# Altium footprint library MODULE.PcbLib: 33 footprints (part 3 of 3)
Each footprint in its own frame and in the unit in brackets; x right, y up, seen from the top. Pads: shape width x height; smd on the part's side, far side on the other; paste and mask are expansions set on the pad; w line width, h text height; cw(c..) or ccw(c..) is an arc to the next point about the centre after c.
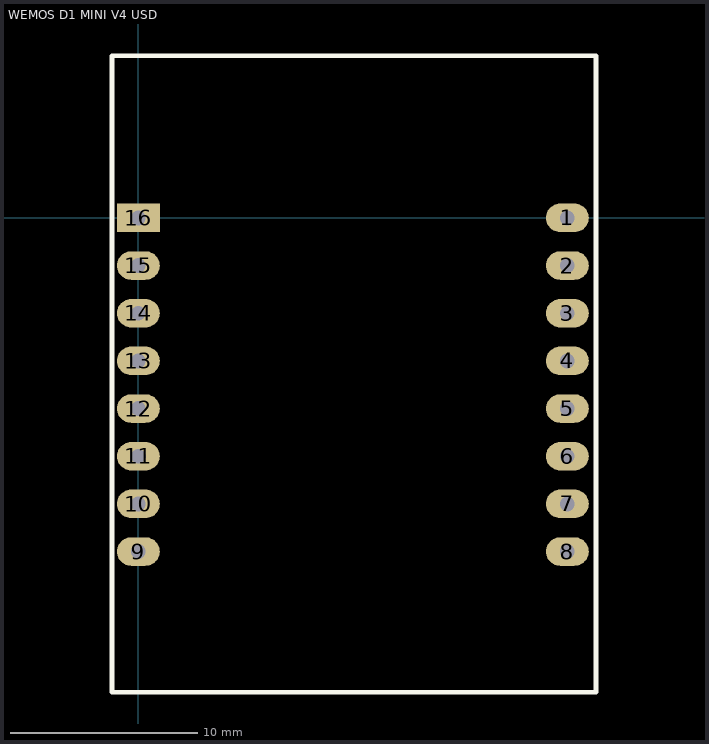
[diagram p2: the footprint, top view; thin cyan lines are the x and y axes]

## WEMOS D1 MINI V4 USD [mil]
pads (16):
  oval 90x60 hole 31: 1(900,0) 2(900,-100) 3(900,-200) 4(900,-300) 5(900,-400) 6(900,-500) 7(900,-600) 8(900,-700) 9(0,-700) 10(0,-600) 11(0,-500) 12(0,-400) 13(0,-300) 14(0,-200) 15(0,-100)
  rect 90x60 hole 31: 16(0,0)
Top Overlay:
  lines w10: -55,-995 960,-995 960,340 -55,340 -55,-995
3D body "wemos d1 mini V4.STEP": height 173.39, standoff 10.01, extent -46.97,-991.42 956.97,333.39